# Altium footprint library bethu.PcbLib: 628 footprints (part 23 of 40)
Each footprint in its own frame and in the unit in brackets; x right, y up, seen from the top. Pads: shape width x height; smd on the part's side, far side on the other; paste and mask are expansions set on the pad; w line width, h text height; cw(c..) or ccw(c..) is an arc to the next point about the centre after c.
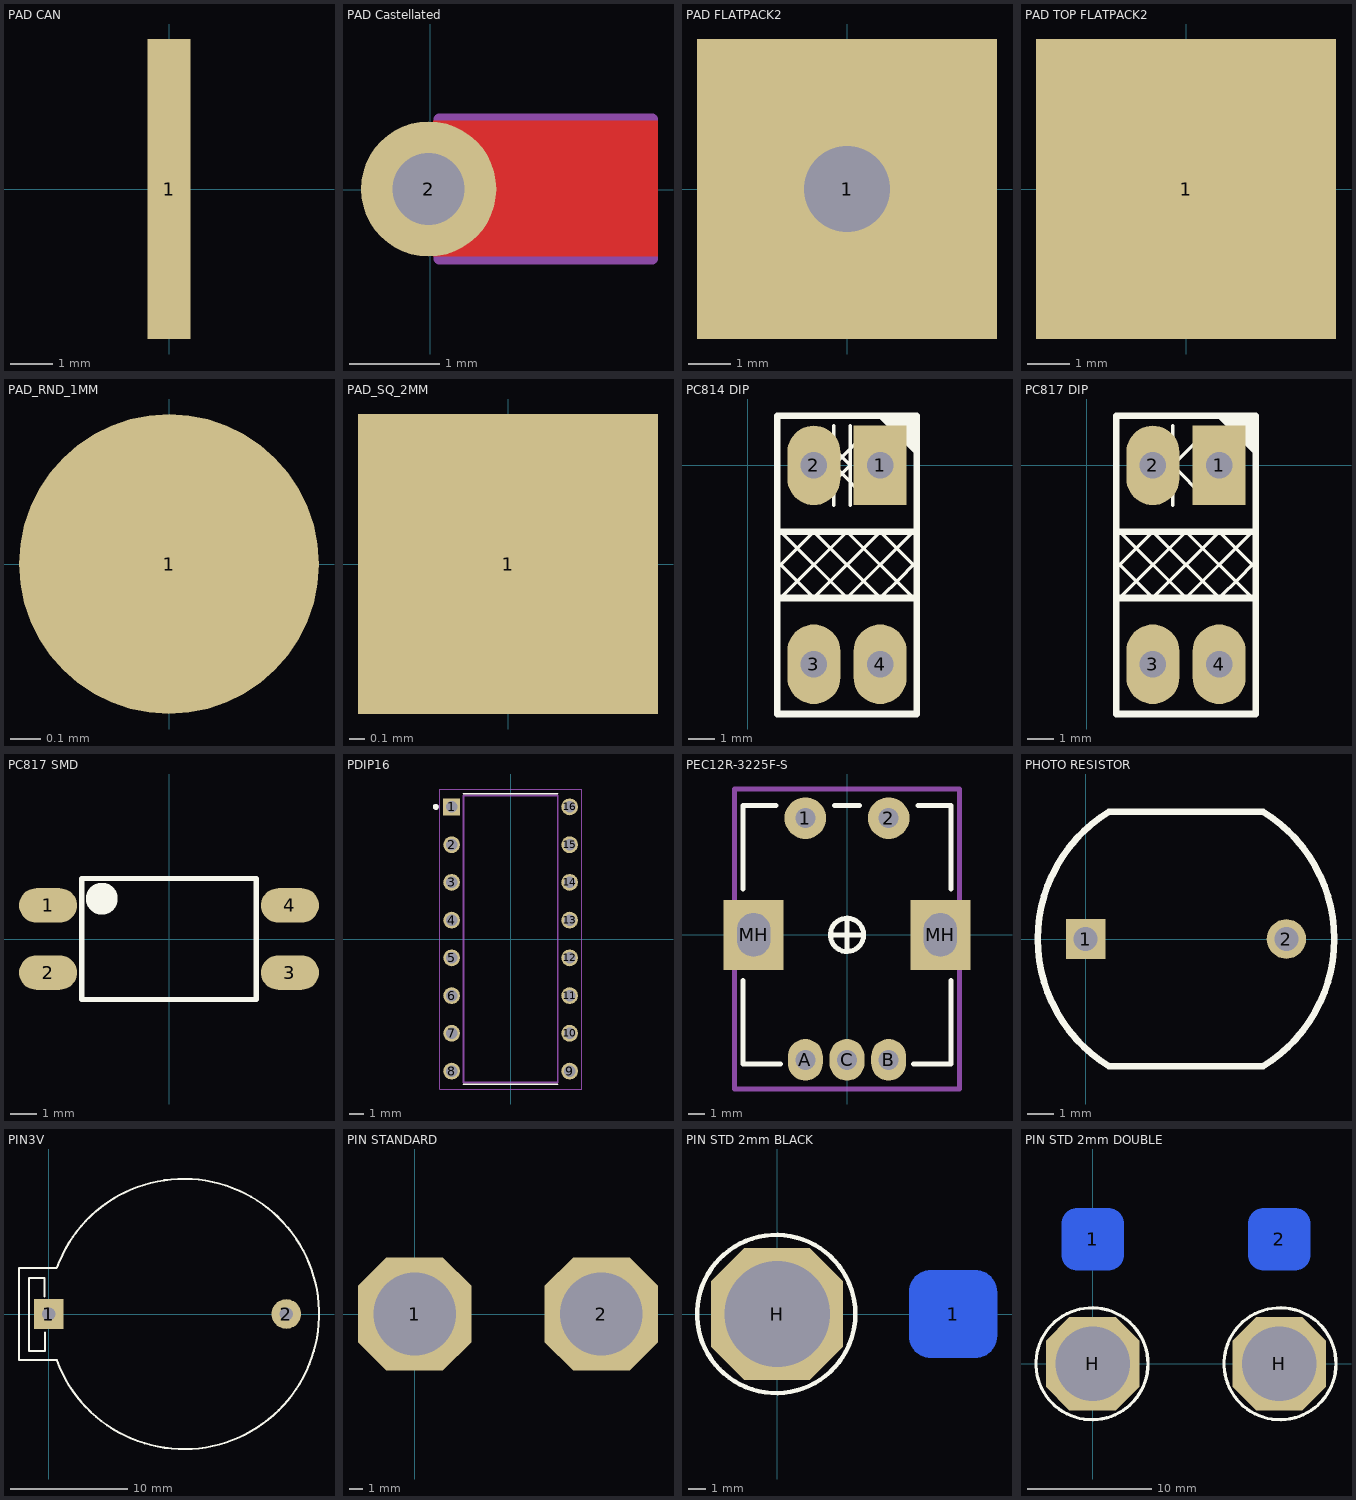
[diagram p22: the footprints below, top view; thin cyan lines are the x and y axes]

## PAD CAN [mm]
pads (1):
  rect 1x7 smd: 1(0,0)

## PAD Castellated [mm]
pads (1):
  round 1.5 hole 0.8: 2(-0.015,0.006)
Top Layer:
  region: 0.038,-0.737 2.528,-0.737 2.528,0.743 2.528,0.745 2.527,0.75 2.527,0.755 2.526,0.76 2.525,0.762 0.038,0.762
Mechanical 1:
  lines w0.127: 2.464,0.743 2.464,-0.768 0.102,-0.768 ; 2.464,0.781 0.102,0.781 ; 0.102,-0.768 ccw(c-0.015,0.006) 0.102,0.781 ; 0.102,-0.768 0.102,-0.044 0.102,0.781

## PAD FLATPACK2 [mm]
pads (1):
  rect 7x7 hole 2: 1(0,0)

## PAD TOP FLATPACK2 [mm]
pads (1):
  rect 7x7 smd: 1(0,0)

## PAD_RND_1MM [mm]
pads (1):
  round 1 smd paste-0.5 mask+0: 1(0,0)

## PAD_SQ_2MM [mm]
pads (1):
  rect 2x2 smd paste-1: 1(0,0)

## PC814 DIP [mil]
pads (4):
  rect 80x120 hole 40: 1(200,0)
  oval 80x120 hole 40: 2(100,0) 3(100,-300) 4(200,-300)
Top Overlay:
  region: 257.5,77.5 192.5,77.5 257.5,12.5
  lines w5: 50,-200 150,-100 250,-200 ; 50,-100 150,-200 250,-100 ; 130,-60 130,60 ; 155,-60 155,60 ; 105,-50 105,50 ; 105,-50 155,0 105,50 ; 105,-50 105,50 ; 180,-50 130,0 180,50 ; 180,-50 180,50 ; 180,-50 180,50 ; 50,-150 100,-100 200,-200 230,-170 250,-150 200,-100 100,-200 90,-190 50,-150
  lines w10: 50,-200 250,-200 ; 50,-100 250,-100 ; 45,-375 45,75 255,75 255,-375 45,-375
3D body "User Library-PC814.STEP": height 144.09, standoff -90.55, extent 59.44,-305.12 240.54,5.11

## PC817 DIP [mil]
pads (4):
  rect 80x120 hole 40: 1(200,0)
  oval 80x120 hole 40: 2(100,0) 3(100,-300) 4(200,-300)
Top Overlay:
  region: 257.5,77.5 192.5,77.5 257.5,12.5
  lines w5: 50,-200 150,-100 250,-200 ; 50,-100 150,-200 250,-100 ; 130,-60 130,60 ; 180,-50 180,50 ; 180,-50 180,50 ; 180,-50 130,0 180,50 ; 50,-150 90,-190 100,-200 200,-100 250,-150 230,-170 200,-200 100,-100 50,-150
  lines w10: 50,-200 250,-200 ; 50,-100 250,-100 ; 45,-375 255,-375 255,75 45,75 45,-375
3D body "User Library-DIP4-7_62-2_54.STEP": height 169.29, standoff -106.3, extent 59.64,-305.11 240.37,5.12

## PC817 SMD [mm] "SMD"
pads (4):
  oval 2.2x1.3 smd: 1(-4.572,1.27) 2(-4.572,-1.27) 3(4.572,-1.27) 4(4.572,1.27)
Top Overlay:
  circle w1: c-2.54,1.524 r0.1
  lines w0.2: -3.3,-2.29 3.3,-2.29 3.3,2.29 -3.3,2.29 -3.3,-2.29
3D body "User Library-PC817_Gullwing.STEP": height 3.95, standoff 0.1, extent -4.873,-2.29 5.127,2.29

## PDIP16 [mm]
pads (16):
  rect 1.13x1.13 / inner round 1.13 / far side rect 1.13x1.13 hole 0.78: 1(-3.97,8.89)
  round 1.13 hole 0.78: 2(-3.97,6.35) 3(-3.97,3.81) 4(-3.97,1.27) 5(-3.97,-1.27) 6(-3.97,-3.81) 7(-3.97,-6.35) 8(-3.97,-8.89) 9(3.97,-8.89) 10(3.97,-6.35) 11(3.97,-3.81) 12(3.97,-1.27) 13(3.97,1.27) 14(3.97,3.81) 15(3.97,6.35) 16(3.97,8.89)
Top Overlay:
  circle w0.2: c-5.035,8.89 r0.1
  lines w0.127: -3.175,-9.775 3.175,-9.775 ; -3.175,9.775 3.175,9.775
Mechanical 13:
  circle w0.2: c-5.035,8.89 r0.1
  lines w0.127: -3.175,-9.653 3.175,-9.653 3.175,9.653 -3.175,9.653 -3.175,-9.653
Mechanical 15:
  lines w0.05: -4.785,-10.095 4.785,-10.095 4.785,10.095 -4.785,10.095 -4.785,-10.095
3D body "step_temp.STEP": height 5.08, standoff -3, extent -4.153,-9.653 4.153,9.653

## PEC12R-3225F-S [mm]
pads (7):
  round 2.5 hole 1.2: 1(-2.5,7) 2(2.5,7)
  oval 2.1x2.5 hole 1.2: A(-2.5,-7.5) B(2.5,-7.5) C(0,-7.5)
  rect 3.6x4.2 hole 2 slot 2.6 at 90 deg: MH(-5.6,0) MH(5.6,0)
Top Overlay:
  circle w0.3: c0,0 r1
  lines w0.3: -6.25,-2.75 -6.25,-7.75 -4,-7.75 ; -6.25,2.75 -6.25,7.75 -4.25,7.75 ; -1,0 1,0 ; -0.75,7.75 0.75,7.75 ; 0,-1 0,1 ; 4,-7.75 6.25,-7.75 6.25,-2.75 ; 4.25,7.75 6.25,7.75 6.25,2.75
Mechanical 13:
  lines w0.3: -6.75,-9.25 -6.75,8.75 6.75,8.75 6.75,-9.25 -6.75,-9.25
  text "'.Designator'" at -5.665,-0.417 h1
3D body "PEC12R-3225F-S.step": height 25.01, standoff -3.49, extent -5.75,-7.25 5.75,7.25

## PHOTO RESISTOR [mm] "Connector; Header; 2 Position"
pads (2):
  rect 1.5x1.5 hole 0.9: 1(0,0)
  round 1.5 hole 0.9: 2(7.62,0)
Top Overlay:
  lines w0.254: 0.889,-4.826 cw(c3.843,0) 0.889,4.826 6.731,4.826 cw(c3.777,0) 6.731,-4.826 0.889,-4.826
3D body "User Library-PDV-P5001.STEP": height 19.44, standoff -19.44, extent -1.815,-4.826 9.435,4.724

## PIN3V [mil] "Socket PIN 3V"
pads (2):
  rect 100x100 hole 45: 1(0,0)
  round 100 hole 45: 2(800,0)
Top Overlay:
  lines w7: -14,59 -14,121 -66,121 -66,-124 -13,-124 -13,-63 ; 26.33,155 -100,155 -100,-155 27.93,-155 ; 27.6,156.07 cw(c455,0) 27.93,-156.97
3D body "batter2.STEP": height 278.16, standoff -137.2, extent -128.09,-446.83 1001.83,448.83

## PIN STANDARD [mm] "Connector; Header; 2 Position"
pads (2):
  oct 8.5x8.5 hole 6.2: 1(0,0) 2(14,0)
3D body "bananas4.STEP": height 41, standoff 1, extent -4.888,-2.714 19.112,2.286
3D body "redversion.STEP": height 11, standoff -11.2, extent 9.542,-4.428 18.542,4.572
3D body "redversion.STEP": height 11, standoff -11.2, extent -4.5,-4.5 4.5,4.5

## PIN STD 2mm BLACK [mm] "Connector; Header; 2 Position"
pads (2):
  rrect50% 5x5 smd far side: 1(10,0)
  oct 7.5x7.5 hole 6: H(0,0)
Top Overlay:
  circle w0.254: c-0.055,0 r4.5
3D body "User Library-SLB2_F2_8_SOCKET_BLACK_SOLID.STEP": height 21.2, standoff -6.8, extent -5.15,-5.15 5.15,5.15

## PIN STD 2mm DOUBLE [mm] "Connector; Header; 2 Position"
pads (4):
  rrect50% 5x5 smd far side: 1(0,10) 2(15,10)
  oct 7.5x7.5 hole 6: H(0,0) H(15,0)
Top Overlay:
  circle w0.254: c15.058,0 r4.5
  circle w0.254: c-0.055,0 r4.5
3D body "User Library-SLB2_F2_8_SOCKET_RED_SOLID.STEP": height 6.8, standoff -21.2, extent 9.85,-5.15 20.15,5.15
3D body "User Library-SLB2_F2_8_SOCKET_RED_SOLID.STEP": height 6.8, standoff -21.2, extent -5.15,-5.15 5.15,5.15